# Altium footprint library Relays.PcbLib: 115 footprints (part 7 of 8) (continued)
## REL_TYCO_SCHRACK_SR6C [mm] "14 Leads, Row Spacing 10mm; Body 55mm x 16.5mm, TYCO SR6 Series"
height 16.5
pads (14):
  round 2 hole 1.3: 13(3.45,5) 14(-1.55,5) 21(-2.55,-5) 22(2.45,-5) 33(14.45,5) 34(9.45,5) 43(13.95,-5) 44(8.95,-5) 53(25.45,5) 54(20.45,5) 63(25.45,-5) 64(20.45,-5) A1(-25.05,6.25) A2(-25.05,-6.25)
Top Overlay:
  lines w0.2: -22.86,-6.25 -21,-6.25 -21,-0.5 ; -22.86,6.25 -21,6.25 -21,0.5 ; -21.25,-0.5 -20.75,0.5 ; -2.55,-3.25 -2.55,-2.25 -1.3,-2.25 -1.3,-1.25 ; -2.55,3.25 -2.55,2.25 -1.3,2.25 1.2,1.25 ; -1.55,-1.5 1.2,-2.25 2.45,-2.25 2.45,-3.25 ; 1.2,2.25 2.45,2.25 2.45,3.25 ; 8.95,-3.25 8.95,-2.25 10.2,-2.25 12.7,-1.25 ; 8.95,3.25 8.95,2.25 10.2,2.25 12.7,1.25 ; 12.7,-2.25 13.95,-2.25 13.95,-3.25 ; 12.7,2.25 13.95,2.25 13.95,3.25 ; 20.45,-3.25 20.45,-2.25 21.7,-2.25 24.2,-1.25 ; 20.45,3.25 20.45,2.25 21.7,2.25 24.2,1.25 ; 24.2,-2.25 25.45,-2.25 25.45,-3.25 ; 24.2,2.25 25.45,2.25 25.45,3.25 ; -27.5,-7.75 ccw(c-27,-7.75) -27,-8.25 27,-8.25 ccw(c27,-7.75) 27.5,-7.75 27.5,7.75 ccw(c27,7.75) 27,8.25 -27,8.25 ccw(c-27,7.75) -27.5,7.75 -27.5,-7.75 ; -22,-0.5 -20,-0.5 -20,0.5 -22,0.5 -22,-0.5
Mechanical 8:
  lines w0.1: -25.55,-6.25 -25.05,-6.25 ; -25.55,6.25 -25.05,6.25 ; -25.05,-6.75 -25.05,-6.25 ; -25.05,-5.75 -25.05,-6.25 ; -25.05,5.75 -25.05,6.25 ; -25.05,6.75 -25.05,6.25 ; -24.55,-6.25 -25.05,-6.25 ; -24.55,6.25 -25.05,6.25 ; -3.05,-5 -2.55,-5 ; -2.55,-5.5 -2.55,-5 ; -2.55,-4.5 -2.55,-5 ; -2.05,-5 -2.55,-5 ; -2.05,5 -1.55,5 ; -1.55,4.5 -1.55,5 ; -1.55,5.5 -1.55,5 ; -1.05,5 -1.55,5 ; -0.5,0 0,0 ; 0,-0.5 0,0 ; 0,0.5 0,0 ; 0.5,0 0,0 ; 1.95,-5 2.45,-5 ; 2.45,-5.5 2.45,-5 ; 2.45,-4.5 2.45,-5 ; 2.95,-5 2.45,-5 ; 2.95,5 3.45,5 ; 3.45,4.5 3.45,5 ; 3.45,5.5 3.45,5 ; 3.95,5 3.45,5 ; 8.45,-5 8.95,-5 ; 8.95,-5.5 8.95,-5 ; 8.95,-4.5 8.95,-5 ; 8.95,5 9.45,5 ; 9.45,-5 8.95,-5 ; 9.45,4.5 9.45,5 ; 9.45,5.5 9.45,5 ; 9.95,5 9.45,5 ; 13.45,-5 13.95,-5 ; 13.95,-5.5 13.95,-5 ; 13.95,-4.5 13.95,-5 ; 13.95,5 14.45,5 ; 14.45,-5 13.95,-5 ; 14.45,4.5 14.45,5 ; 14.45,5.5 14.45,5 ; 14.95,5 14.45,5 ; 19.95,-5 20.45,-5 ; 19.95,5 20.45,5 ; 20.45,-5.5 20.45,-5 ; 20.45,-4.5 20.45,-5 ; 20.45,4.5 20.45,5 ; 20.45,5.5 20.45,5 ; 20.95,-5 20.45,-5 ; 20.95,5 20.45,5 ; 24.95,-5 25.45,-5 ; 24.95,5 25.45,5 ; 25.45,-5.5 25.45,-5 ; 25.45,-4.5 25.45,-5 ; 25.45,4.5 25.45,5 ; 25.45,5.5 25.45,5 ; 25.95,-5 25.45,-5 ; 25.95,5 25.45,5
Mechanical 14:
  lines w0.1: -22.86,-6.25 -21,-6.25 -21,-0.5 ; -22.86,6.25 -21,6.25 -21,0.5 ; -21.25,-0.5 -20.75,0.5 ; -2.55,-3.25 -2.55,-2.25 -1.3,-2.25 -1.3,-1.25 ; -2.55,3.25 -2.55,2.25 -1.3,2.25 1.2,1.25 ; -1.55,-1.5 1.2,-2.25 2.45,-2.25 2.45,-3.25 ; 1.2,2.25 2.45,2.25 2.45,3.25 ; 8.95,-3.25 8.95,-2.25 10.2,-2.25 12.7,-1.25 ; 8.95,3.25 8.95,2.25 10.2,2.25 12.7,1.25 ; 12.7,-2.25 13.95,-2.25 13.95,-3.25 ; 12.7,2.25 13.95,2.25 13.95,3.25 ; 20.45,-3.25 20.45,-2.25 21.7,-2.25 24.2,-1.25 ; 20.45,3.25 20.45,2.25 21.7,2.25 24.2,1.25 ; 24.2,-2.25 25.45,-2.25 25.45,-3.25 ; 24.2,2.25 25.45,2.25 25.45,3.25 ; -27.5,-7.75 ccw(c-27,-7.75) -27,-8.25 27,-8.25 ccw(c27,-7.75) 27.5,-7.75 27.5,7.75 ccw(c27,7.75) 27,8.25 -27,8.25 ccw(c-27,7.75) -27.5,7.75 -27.5,-7.75 ; -22,-0.5 -22,0.5 -20,0.5 -20,-0.5 -22,-0.5
3D body "REL_TYCO_SCHRACK_SR6C.stp": height 16.5, standoff -3.3, extent -27.5,-8.25 27.5,8.25

## RELS_ENERDIS_65F-P01400153A [mm] "16 Leads, Row Spacing 10mm; Body 40mm x 45mm, Socket Relay, ENERDIS 65F Series"
height 21.5
Top Overlay:
  lines w0.2: -20,-22.5 -20,22.5 20,22.5 20,-22.5 -20,-22.5
Mechanical 8:
  circle w0.1: c0,0 r1.6
  circle w0.1: c17.5,0 r1.6
  lines w0.1: -15.5,-15.8 -15,-15.8 ; -15.5,-5.8 -15,-5.8 ; -15.5,5.8 -15,5.8 ; -15.5,15.8 -15,15.8 ; -15,-16.3 -15,-15.8 ; -15,-15.3 -15,-15.8 ; -15,-6.3 -15,-5.8 ; -15,-5.3 -15,-5.8 ; -15,5.3 -15,5.8 ; -15,6.3 -15,5.8 ; -15,15.3 -15,15.8 ; -15,16.3 -15,15.8 ; -14.5,-15.8 -15,-15.8 ; -14.5,-5.8 -15,-5.8 ; -14.5,5.8 -15,5.8 ; -14.5,15.8 -15,15.8 ; -5.5,-15.8 -5,-15.8 ; -5.5,-5.8 -5,-5.8 ; -5.5,5.8 -5,5.8 ; -5.5,15.8 -5,15.8 ; -5,-16.3 -5,-15.8 ; -5,-15.3 -5,-15.8 ; -5,-6.3 -5,-5.8 ; -5,-5.3 -5,-5.8 ; -5,5.3 -5,5.8 ; -5,6.3 -5,5.8 ; -5,15.3 -5,15.8 ; -5,16.3 -5,15.8 ; -4.5,-15.8 -5,-15.8 ; -4.5,-5.8 -5,-5.8 ; -4.5,5.8 -5,5.8 ; -4.5,15.8 -5,15.8 ; -0.5,0 0,0 ; 0,-0.5 0,0 ; 0,0.5 0,0 ; 0.5,0 0,0 ; 4.5,-15.8 5,-15.8 ; 4.5,-5.8 5,-5.8 ; 4.5,5.8 5,5.8 ; 4.5,15.8 5,15.8 ; 5,-16.3 5,-15.8 ; 5,-15.3 5,-15.8 ; 5,-6.3 5,-5.8 ; 5,-5.3 5,-5.8 ; 5,5.3 5,5.8 ; 5,6.3 5,5.8 ; 5,15.3 5,15.8 ; 5,16.3 5,15.8 ; 5.5,-15.8 5,-15.8 ; 5.5,-5.8 5,-5.8 ; 5.5,5.8 5,5.8 ; 5.5,15.8 5,15.8 ; 14.5,-15.8 15,-15.8 ; 14.5,-5.8 15,-5.8 ; 14.5,5.8 15,5.8 ; 14.5,15.8 15,15.8 ; 15,-16.3 15,-15.8 ; 15,-15.3 15,-15.8 ; 15,-6.3 15,-5.8 ; 15,-5.3 15,-5.8 ; 15,5.3 15,5.8 ; 15,6.3 15,5.8 ; 15,15.3 15,15.8 ; 15,16.3 15,15.8 ; 15.5,-15.8 15,-15.8 ; 15.5,-5.8 15,-5.8 ; 15.5,5.8 15,5.8 ; 15.5,15.8 15,15.8 ; 17,0 17.5,0 ; 17.5,-0.5 17.5,0 ; 17.5,0.5 17.5,0 ; 18,0 17.5,0
Mechanical 14:
  lines w0.1: -20,-22.5 -20,22.5 20,22.5 20,-22.5 -20,-22.5
3D body "RELS_ENERDIS_65F-P01400153A.stp": height 21.5, standoff -3.5, extent -20,-22.5 20,22.5

## RELS_ENERDIS_65F-P01400153A_A [mm] "16 Leads, Row Spacing 10mm; Body 40mm x 45mm, Socket Relay, ENERDIS 65F Series"
height 21.5
pads (18):
  round 3.9 hole 3.2: 1(0,0) 1(17.5,0)
  round 2.3 hole 1.6: a1(15,15.8) a2(5,15.8) a3(-5,15.8) a4(-15,15.8) b1(15,5.8) b2(5,5.8) b3(-5,5.8) b4(-15,5.8) c1(15,-5.8) c2(5,-5.8) c3(-5,-5.8) c4(-15,-5.8) d1(15,-15.8) d2(5,-15.8) d3(-5,-15.8) d4(-15,-15.8)
Top Overlay:
  lines w0.2: -20,-22.5 -20,22.5 20,22.5 20,-22.5 -20,-22.5
Mechanical 8:
  circle w0.1: c0,0 r1.6
  circle w0.1: c17.5,0 r1.6
  lines w0.1: -15.5,-15.8 -15,-15.8 ; -15.5,-5.8 -15,-5.8 ; -15.5,5.8 -15,5.8 ; -15.5,15.8 -15,15.8 ; -15,-16.3 -15,-15.8 ; -15,-15.3 -15,-15.8 ; -15,-6.3 -15,-5.8 ; -15,-5.3 -15,-5.8 ; -15,5.3 -15,5.8 ; -15,6.3 -15,5.8 ; -15,15.3 -15,15.8 ; -15,16.3 -15,15.8 ; -14.5,-15.8 -15,-15.8 ; -14.5,-5.8 -15,-5.8 ; -14.5,5.8 -15,5.8 ; -14.5,15.8 -15,15.8 ; -5.5,-15.8 -5,-15.8 ; -5.5,-5.8 -5,-5.8 ; -5.5,5.8 -5,5.8 ; -5.5,15.8 -5,15.8 ; -5,-16.3 -5,-15.8 ; -5,-15.3 -5,-15.8 ; -5,-6.3 -5,-5.8 ; -5,-5.3 -5,-5.8 ; -5,5.3 -5,5.8 ; -5,6.3 -5,5.8 ; -5,15.3 -5,15.8 ; -5,16.3 -5,15.8 ; -4.5,-15.8 -5,-15.8 ; -4.5,-5.8 -5,-5.8 ; -4.5,5.8 -5,5.8 ; -4.5,15.8 -5,15.8 ; -0.5,0 0,0 ; 0,-0.5 0,0 ; 0,0.5 0,0 ; 0.5,0 0,0 ; 4.5,-15.8 5,-15.8 ; 4.5,-5.8 5,-5.8 ; 4.5,5.8 5,5.8 ; 4.5,15.8 5,15.8 ; 5,-16.3 5,-15.8 ; 5,-15.3 5,-15.8 ; 5,-6.3 5,-5.8 ; 5,-5.3 5,-5.8 ; 5,5.3 5,5.8 ; 5,6.3 5,5.8 ; 5,15.3 5,15.8 ; 5,16.3 5,15.8 ; 5.5,-15.8 5,-15.8 ; 5.5,-5.8 5,-5.8 ; 5.5,5.8 5,5.8 ; 5.5,15.8 5,15.8 ; 14.5,-15.8 15,-15.8 ; 14.5,-5.8 15,-5.8 ; 14.5,5.8 15,5.8 ; 14.5,15.8 15,15.8 ; 15,-16.3 15,-15.8 ; 15,-15.3 15,-15.8 ; 15,-6.3 15,-5.8 ; 15,-5.3 15,-5.8 ; 15,5.3 15,5.8 ; 15,6.3 15,5.8 ; 15,15.3 15,15.8 ; 15,16.3 15,15.8 ; 15.5,-15.8 15,-15.8 ; 15.5,-5.8 15,-5.8 ; 15.5,5.8 15,5.8 ; 15.5,15.8 15,15.8 ; 17,0 17.5,0 ; 17.5,-0.5 17.5,0 ; 17.5,0.5 17.5,0 ; 18,0 17.5,0
Mechanical 14:
  lines w0.1: -20,-22.5 -20,22.5 20,22.5 20,-22.5 -20,-22.5

## RELS_FINDER_94.12 [mm] "Graphical Model for Relay Socket, FINDER_94.12 Series (Do Not Use Alone, Use Only With Relay)"
height 11.5
pads (2):
  round 1.5 smd paste-0.76 mask-0.76: 13(6.6,-7.25) 14(-6.6,-7.25)
Top Overlay:
  lines w0.2: -2,-14.75 -2,-14.25 2,-14.25 2,-14.75 ; -2,14.75 -2,14.25 2,14.25 2,14.75 ; -1,-14.25 -1,-14.75 -9.75,-14.75 cw(c-9.75,-13.75) -10.75,-13.75 -10.75,13.75 cw(c-9.75,13.75) -9.75,14.75 -1,14.75 -1,14.25 ; 1,-14.25 1,-14.75 9.75,-14.75 ccw(c9.75,-13.75) 10.75,-13.75 10.75,13.75 ccw(c9.75,13.75) 9.75,14.75 1,14.75 1,14.25
Mechanical 8:
  lines w0.1: -7.6,-7.25 -6.6,-7.25 -6.6,-8.25 ; -7.6,-0.95 -6.6,-0.95 -6.6,-1.95 ; -7.6,5.35 -6.6,5.35 -6.6,4.35 ; -7.6,9.45 -6.6,9.45 -6.6,8.45 ; 5.6,-7.25 6.6,-7.25 6.6,-8.25 ; 5.6,-0.95 6.6,-0.95 6.6,-1.95 ; 5.6,5.35 6.6,5.35 6.6,4.35 ; 5.6,9.45 6.6,9.45 6.6,8.45
  text "A1" at 9.35,-8.25 h1.5
  text "11" at 9.35,-1.7 h1.5
  text "12" at 9.35,8.45 h1.5
  text "14" at 9.35,4.35 h1.5
  text "13" at 5.35,-8.25 h1.5
  text "9" at 5.35,-1.45 h1.5
  text "1" at 5.35,9.2 h1.5
  text "5" at 5.35,4.85 h1.5
  text "14" at -3.85,-8.25 h1.5
  text "12" at -3.85,-1.95 h1.5
  text "4" at -3.85,8.95 h1.5
  text "8" at -3.85,4.85 h1.5
  text "A2" at -7.85,-8.5 h1.5
  text "41" at -7.85,-1.95 h1.5
  text "42" at -7.85,8.2 h1.5
  text "44" at -7.85,4.1 h1.5
  text "Must be Used with FINDER 55.32 Relay" at 2.54,-12.7 h0.95
Mechanical 14:
  lines w0.1: -2,-14.75 -2,-14.25 2,-14.25 2,-14.75 ; -2,14.75 -2,14.25 2,14.25 2,14.75 ; -1,-14.25 -1,-14.75 -9.75,-14.75 cw(c-9.75,-13.75) -10.75,-13.75 -10.75,13.75 cw(c-9.75,13.75) -9.75,14.75 -1,14.75 -1,14.25 ; 1,-14.25 1,-14.75 9.75,-14.75 ccw(c9.75,-13.75) 10.75,-13.75 10.75,13.75 ccw(c9.75,13.75) 9.75,14.75 1,14.75 1,14.25 ; -8.101,-8.45 -5.101,-8.45 -5.101,-6.05 -8.101,-6.05 -8.101,-8.45 ; -8.101,-2.15 -5.101,-2.15 -5.101,0.25 -8.101,0.25 -8.101,-2.15 ; -8.101,4.15 -5.101,4.15 -5.101,6.55 -8.101,6.55 -8.101,4.15 ; -8.101,8.25 -5.101,8.25 -5.101,10.65 -8.101,10.65 -8.101,8.25 ; 5.1,-8.45 8.1,-8.45 8.1,-6.05 5.1,-6.05 5.1,-8.45 ; 5.1,-2.15 8.1,-2.15 8.1,0.25 5.1,0.25 5.1,-2.15 ; 5.1,4.15 8.1,4.15 8.1,6.55 5.1,6.55 5.1,4.15 ; 5.1,8.25 8.1,8.25 8.1,10.65 5.1,10.65 5.1,8.25
3D body "RELS_FINDER_94.12.stp": height 11.5, standoff -3.7, extent -10.749,-14.75 10.751,14.75

## RELS_FINDER_94.12_a [mm] "8 Leads Relay Socket, Row Spacing 13.2mm; Body 21.5mm x 29.5mm, FINDER_94.12 Series (Use Only Without Relay)"
height 11.5
pads (8):
  round 2.2 hole 1.5: 1(6.6,9.45) 4(-6.6,9.45) 5(6.6,5.35) 8(-6.6,5.35) 9(6.6,-0.95) 12(-6.6,-0.95) 13(6.6,-7.25) 14(-6.6,-7.25)
Top Overlay:
  lines w0.2: -2,-14.75 -2,-14.25 2,-14.25 2,-14.75 ; -2,14.75 -2,14.25 2,14.25 2,14.75 ; -1,-14.25 -1,-14.75 -9.75,-14.75 cw(c-9.75,-13.75) -10.75,-13.75 -10.75,13.75 cw(c-9.75,13.75) -9.75,14.75 -1,14.75 -1,14.25 ; 1,-14.25 1,-14.75 9.75,-14.75 ccw(c9.75,-13.75) 10.75,-13.75 10.75,13.75 ccw(c9.75,13.75) 9.75,14.75 1,14.75 1,14.25
Mechanical 8:
  lines w0.1: -7.6,-7.25 -6.6,-7.25 -6.6,-8.25 ; -7.6,-0.95 -6.6,-0.95 -6.6,-1.95 ; -7.6,5.35 -6.6,5.35 -6.6,4.35 ; -7.6,9.45 -6.6,9.45 -6.6,8.45 ; -1,0 0,0 0,-1 ; 5.6,-7.25 6.6,-7.25 6.6,-8.25 ; 5.6,-0.95 6.6,-0.95 6.6,-1.95 ; 5.6,5.35 6.6,5.35 6.6,4.35 ; 5.6,9.45 6.6,9.45 6.6,8.45
  text "A1" at 9.35,-8.25 h1.5
  text "11" at 9.35,-1.7 h1.5
  text "12" at 9.35,8.45 h1.5
  text "14" at 9.35,4.35 h1.5
  text "13" at 5.35,-8.25 h1.5
  text "9" at 5.35,-1.45 h1.5
  text "1" at 5.35,9.2 h1.5
  text "5" at 5.35,4.85 h1.5
  text "14" at -3.85,-8.25 h1.5
  text "12" at -3.85,-1.95 h1.5
  text "4" at -3.85,8.95 h1.5
  text "8" at -3.85,4.85 h1.5
  text "A2" at -7.85,-8.5 h1.5
  text "41" at -7.85,-1.95 h1.5
  text "42" at -7.85,8.2 h1.5
  text "44" at -7.85,4.1 h1.5
Mechanical 14:
  lines w0.1: -2,-14.75 -2,-14.25 2,-14.25 2,-14.75 ; -2,14.75 -2,14.25 2,14.25 2,14.75 ; -1,-14.25 -1,-14.75 -9.75,-14.75 cw(c-9.75,-13.75) -10.75,-13.75 -10.75,13.75 cw(c-9.75,13.75) -9.75,14.75 -1,14.75 -1,14.25 ; 1,-14.25 1,-14.75 9.75,-14.75 ccw(c9.75,-13.75) 10.75,-13.75 10.75,13.75 ccw(c9.75,13.75) 9.75,14.75 1,14.75 1,14.25 ; -8.101,-8.45 -5.101,-8.45 -5.101,-6.05 -8.101,-6.05 -8.101,-8.45 ; -8.101,-2.15 -5.101,-2.15 -5.101,0.25 -8.101,0.25 -8.101,-2.15 ; -8.101,4.15 -5.101,4.15 -5.101,6.55 -8.101,6.55 -8.101,4.15 ; -8.101,8.25 -5.101,8.25 -5.101,10.65 -8.101,10.65 -8.101,8.25 ; 5.1,-8.45 8.1,-8.45 8.1,-6.05 5.1,-6.05 5.1,-8.45 ; 5.1,-2.15 8.1,-2.15 8.1,0.25 5.1,0.25 5.1,-2.15 ; 5.1,4.15 8.1,4.15 8.1,6.55 5.1,6.55 5.1,4.15 ; 5.1,8.25 8.1,8.25 8.1,10.65 5.1,10.65 5.1,8.25
3D body "RELS_FINDER_94.12.stp": height 11.5, standoff -3.7, extent -10.749,-14.75 10.751,14.75

## RELS_FINDER_94.14SMA [mm] "Graphical Model for Relay Socket, FINDER_94.14 Series (Do Not Use Alone, Use Only With Relay)"
height 11.5
pads (2):
  round 1.5 smd paste-0.76 mask-0.76: 13(6.6,-7.25) 14(-6.6,-7.25)
Top Overlay:
  lines w0.2: -2,-14.75 -2,-14.25 2,-14.25 2,-14.75 ; -2,14.75 -2,14.25 2,14.25 2,14.75 ; -1,-14.75 -1,-14.25 ; -1,14.25 -1,14.75 ; 1,-14.75 1,-14.25 ; 1,14.25 1,14.75 ; -10.75,-13.75 ccw(c-9.75,-13.75) -9.75,-14.75 9.75,-14.75 ccw(c9.75,-13.75) 10.75,-13.75 10.75,13.75 ccw(c9.75,13.75) 9.75,14.75 -9.75,14.75 ccw(c-9.75,13.75) -10.75,13.75 -10.75,-13.75
Mechanical 8:
  lines w0.1: -7.6,9.45 -6.6,9.45 ; -7.1,-7.25 -6.6,-7.25 ; -7.1,-0.95 -6.6,-0.95 ; -7.1,5.35 -6.6,5.35 ; -7.1,9.45 -6.6,9.45 ; -6.6,-7.75 -6.6,-7.25 ; -6.6,-6.75 -6.6,-7.25 ; -6.6,-1.45 -6.6,-0.95 ; -6.6,-0.45 -6.6,-0.95 ; -6.6,4.85 -6.6,5.35 ; -6.6,5.85 -6.6,5.35 ; -6.6,8.45 -6.6,9.45 ; -6.6,8.95 -6.6,9.45 ; -6.6,9.95 -6.6,9.45 ; -6.1,-7.25 -6.6,-7.25 ; -6.1,-0.95 -6.6,-0.95 ; -6.1,5.35 -6.6,5.35 ; -6.1,9.45 -6.6,9.45 ; -2.7,-0.95 -2.2,-0.95 ; -2.7,5.35 -2.2,5.35 ; -2.7,9.45 -2.2,9.45 ; -2.2,-1.45 -2.2,-0.95 ; -2.2,-0.45 -2.2,-0.95 ; -2.2,4.85 -2.2,5.35 ; -2.2,5.85 -2.2,5.35 ; -2.2,8.95 -2.2,9.45 ; -2.2,9.95 -2.2,9.45 ; -1.7,-0.95 -2.2,-0.95 ; -1.7,5.35 -2.2,5.35 ; -1.7,9.45 -2.2,9.45 ; -0.5,0 0,0 ; 0,-0.5 0,0 ; 0,0.5 0,0 ; 0.5,0 0,0 ; 1.7,-0.95 2.2,-0.95 ; 1.7,5.35 2.2,5.35 ; 1.7,9.45 2.2,9.45 ; 2.2,-1.45 2.2,-0.95 ; 2.2,-0.45 2.2,-0.95 ; 2.2,4.85 2.2,5.35 ; 2.2,5.85 2.2,5.35 ; 2.2,8.95 2.2,9.45 ; 2.2,9.95 2.2,9.45 ; 2.7,-0.95 2.2,-0.95 ; 2.7,5.35 2.2,5.35 ; 2.7,9.45 2.2,9.45 ; 6.1,-7.25 6.6,-7.25 ; 6.1,-0.95 6.6,-0.95 ; 6.1,5.35 6.6,5.35 ; 6.1,9.45 6.6,9.45 ; 6.6,-7.75 6.6,-7.25 ; 6.6,-6.75 6.6,-7.25 ; 6.6,-1.45 6.6,-0.95 ; 6.6,-0.45 6.6,-0.95 ; 6.6,4.85 6.6,5.35 ; 6.6,5.85 6.6,5.35 ; 6.6,8.95 6.6,9.45 ; 6.6,9.95 6.6,9.45 ; 7.1,-7.25 6.6,-7.25 ; 7.1,-0.95 6.6,-0.95 ; 7.1,5.35 6.6,5.35 ; 7.1,9.45 6.6,9.45
  text "14" at -7.9,-8.55 h1.5
  text "13" at 5.3,-8.55 h1.5
  text "12" at -7.85,-1.95 h1.5
  text "4" at -7.9,8.8 h1.5
  text "8" at -7.9,4.8 h1.5
  text "Must be Used with" at -6.5,-3.8 h0.95
  text "7" at -3.5,4.8 h1.5
  text "3" at -3.5,8.9 h1.5
  text "2" at 0.9,8.9 h1.5
  text "6" at 0.9,4.8 h1.5
  text "11" at -3.5,-1.5 h1.5
  text "10" at 0.9,-2 h1.5
  text "9" at 5.3,-1.5 h1.5
  text "5" at 5.3,4.8 h1.5
  text "1" at 5.3,8.9 h1.5
  text "FINDER 55.32 Relay" at -6.55,-5.533 h0.95
Mechanical 14:
  lines w0.1: -2,-14.75 -2,-14.25 2,-14.25 2,-14.75 ; -2,14.75 -2,14.25 2,14.25 2,14.75 ; -1,-14.75 -1,-14.25 ; -1,14.25 -1,14.75 ; 1,-14.75 1,-14.25 ; 1,14.25 1,14.75 ; -10.75,-13.75 ccw(c-9.75,-13.75) -9.75,-14.75 9.75,-14.75 ccw(c9.75,-13.75) 10.75,-13.75 10.75,13.75 ccw(c9.75,13.75) 9.75,14.75 -9.75,14.75 ccw(c-9.75,13.75) -10.75,13.75 -10.75,-13.75 ; -8.142,-8.719 -8.142,-6.319 -5.142,-6.319 -5.142,-8.719 -8.142,-8.719 ; -8.142,-2.369 -5.142,-2.369 -5.142,0.031 -8.142,0.031 -8.142,-2.369 ; -8.142,3.931 -8.142,6.331 -5.142,6.331 -5.142,3.931 -8.142,3.931 ; -8.142,8.031 -8.142,10.431 -5.142,10.431 -5.142,8.031 -8.142,8.031 ; -3.701,-2.369 -3.701,0.031 -0.701,0.031 -0.701,-2.369 -3.701,-2.369 ; -3.701,3.931 -0.701,3.931 -0.701,6.331 -3.701,6.331 -3.701,3.931 ; -3.701,8.031 -0.701,8.031 -0.701,10.431 -3.701,10.431 -3.701,8.031 ; -2,-8.65 -2,-5.25 2,-5.25 2,-8.65 -2,-8.65 ; 0.748,-2.369 0.748,0.031 3.748,0.031 3.748,-2.369 0.748,-2.369 ; 0.748,3.931 0.748,6.331 3.748,6.331 3.748,3.931 0.748,3.931 ; 0.748,8.031 0.748,10.431 3.748,10.431 3.748,8.031 0.748,8.031 ; 5.188,-8.719 8.188,-8.719 8.188,-6.319 5.188,-6.319 5.188,-8.719 ; 5.188,-2.369 5.188,0.031 8.188,0.031 8.188,-2.369 5.188,-2.369 ; 5.188,3.931 8.188,3.931 8.188,6.331 5.188,6.331 5.188,3.931 ; 5.188,8.031 8.188,8.031 8.188,10.431 5.188,10.431 5.188,8.031
3D body "RELS_FINDER_94.14SMA.stp": height 11.5, standoff -3.7, extent -10.75,-14.75 10.75,14.75

## RELS_FINDER_94.14SMA_a [mm] "14 Leads Relay Socket, Row Spacing 4.4mm; Body 21.5mm x 29.5mm, FINDER_94.14 Series (Use Only Without Relay)"
height 11.5
pads (14):
  round 2.2 hole 1.5: 1(6.6,9.35) 2(2.2,9.35) 3(-2.2,9.35) 4(-6.6,9.35) 5(6.6,5.25) 6(2.2,5.25) 7(-2.2,5.25) 8(-6.6,5.25) 9(6.6,-1.1) 10(2.2,-1.1) 11(-2.2,-1.1) 12(-6.6,-1.1) 13(6.6,-7.45) 14(-6.6,-7.45)
Top Overlay:
  lines w0.2: -2,-14.75 -2,-14.25 2,-14.25 2,-14.75 ; -2,14.75 -2,14.25 2,14.25 2,14.75 ; -1,-14.75 -1,-14.25 ; -1,14.25 -1,14.75 ; 1,-14.75 1,-14.25 ; 1,14.25 1,14.75 ; -10.75,-13.75 ccw(c-9.75,-13.75) -9.75,-14.75 9.75,-14.75 ccw(c9.75,-13.75) 10.75,-13.75 10.75,13.75 ccw(c9.75,13.75) 9.75,14.75 -9.75,14.75 ccw(c-9.75,13.75) -10.75,13.75 -10.75,-13.75
Mechanical 8:
  lines w0.1: -7.6,9.45 -6.6,9.45 ; -7.1,-7.25 -6.6,-7.25 ; -7.1,-0.95 -6.6,-0.95 ; -7.1,5.35 -6.6,5.35 ; -7.1,9.45 -6.6,9.45 ; -6.6,-7.75 -6.6,-7.25 ; -6.6,-6.75 -6.6,-7.25 ; -6.6,-1.45 -6.6,-0.95 ; -6.6,-0.45 -6.6,-0.95 ; -6.6,4.85 -6.6,5.35 ; -6.6,5.85 -6.6,5.35 ; -6.6,8.45 -6.6,9.45 ; -6.6,8.95 -6.6,9.45 ; -6.6,9.95 -6.6,9.45 ; -6.1,-7.25 -6.6,-7.25 ; -6.1,-0.95 -6.6,-0.95 ; -6.1,5.35 -6.6,5.35 ; -6.1,9.45 -6.6,9.45 ; -2.7,-0.95 -2.2,-0.95 ; -2.7,5.35 -2.2,5.35 ; -2.7,9.45 -2.2,9.45 ; -2.2,-1.45 -2.2,-0.95 ; -2.2,-0.45 -2.2,-0.95 ; -2.2,4.85 -2.2,5.35 ; -2.2,5.85 -2.2,5.35 ; -2.2,8.95 -2.2,9.45 ; -2.2,9.95 -2.2,9.45 ; -1.7,-0.95 -2.2,-0.95 ; -1.7,5.35 -2.2,5.35 ; -1.7,9.45 -2.2,9.45 ; -0.5,0 0,0 ; 0,-0.5 0,0 ; 0,0.5 0,0 ; 0.5,0 0,0 ; 1.7,-0.95 2.2,-0.95 ; 1.7,5.35 2.2,5.35 ; 1.7,9.45 2.2,9.45 ; 2.2,-1.45 2.2,-0.95 ; 2.2,-0.45 2.2,-0.95 ; 2.2,4.85 2.2,5.35 ; 2.2,5.85 2.2,5.35 ; 2.2,8.95 2.2,9.45 ; 2.2,9.95 2.2,9.45 ; 2.7,-0.95 2.2,-0.95 ; 2.7,5.35 2.2,5.35 ; 2.7,9.45 2.2,9.45 ; 6.1,-7.25 6.6,-7.25 ; 6.1,-0.95 6.6,-0.95 ; 6.1,5.35 6.6,5.35 ; 6.1,9.45 6.6,9.45 ; 6.6,-7.75 6.6,-7.25 ; 6.6,-6.75 6.6,-7.25 ; 6.6,-1.45 6.6,-0.95 ; 6.6,-0.45 6.6,-0.95 ; 6.6,4.85 6.6,5.35 ; 6.6,5.85 6.6,5.35 ; 6.6,8.95 6.6,9.45 ; 6.6,9.95 6.6,9.45 ; 7.1,-7.25 6.6,-7.25 ; 7.1,-0.95 6.6,-0.95 ; 7.1,5.35 6.6,5.35 ; 7.1,9.45 6.6,9.45
  text "12" at -7.85,-1.95 h1.5
  text "4" at -7.9,8.8 h1.5
  text "8" at -7.9,4.8 h1.5
  text "7" at -3.5,4.8 h1.5
  text "3" at -3.5,8.9 h1.5
  text "2" at 0.9,8.9 h1.5
  text "6" at 0.9,4.8 h1.5
  text "11" at -3.5,-1.5 h1.5
  text "10" at 0.9,-2 h1.5
  text "9" at 5.3,-1.5 h1.5
  text "5" at 5.3,4.8 h1.5
  text "1" at 5.3,8.9 h1.5
  text "13" at 5.3,-8.55 h1.5
  text "14" at -7.9,-8.55 h1.5
Mechanical 14:
  lines w0.1: -2,-14.75 -2,-14.25 2,-14.25 2,-14.75 ; -2,14.75 -2,14.25 2,14.25 2,14.75 ; -1,-14.75 -1,-14.25 ; -1,14.25 -1,14.75 ; 1,-14.75 1,-14.25 ; 1,14.25 1,14.75 ; -10.75,-13.75 ccw(c-9.75,-13.75) -9.75,-14.75 9.75,-14.75 ccw(c9.75,-13.75) 10.75,-13.75 10.75,13.75 ccw(c9.75,13.75) 9.75,14.75 -9.75,14.75 ccw(c-9.75,13.75) -10.75,13.75 -10.75,-13.75 ; -8.142,-8.719 -8.142,-6.319 -5.142,-6.319 -5.142,-8.719 -8.142,-8.719 ; -8.142,-2.369 -5.142,-2.369 -5.142,0.031 -8.142,0.031 -8.142,-2.369 ; -8.142,3.931 -8.142,6.331 -5.142,6.331 -5.142,3.931 -8.142,3.931 ; -8.142,8.031 -8.142,10.431 -5.142,10.431 -5.142,8.031 -8.142,8.031 ; -3.701,-2.369 -3.701,0.031 -0.701,0.031 -0.701,-2.369 -3.701,-2.369 ; -3.701,3.931 -0.701,3.931 -0.701,6.331 -3.701,6.331 -3.701,3.931 ; -3.701,8.031 -0.701,8.031 -0.701,10.431 -3.701,10.431 -3.701,8.031 ; -2,-8.65 -2,-5.25 2,-5.25 2,-8.65 -2,-8.65 ; 0.748,-2.369 0.748,0.031 3.748,0.031 3.748,-2.369 0.748,-2.369 ; 0.748,3.931 0.748,6.331 3.748,6.331 3.748,3.931 0.748,3.931 ; 0.748,8.031 0.748,10.431 3.748,10.431 3.748,8.031 0.748,8.031 ; 5.188,-8.719 8.188,-8.719 8.188,-6.319 5.188,-6.319 5.188,-8.719 ; 5.188,-2.369 5.188,0.031 8.188,0.031 8.188,-2.369 5.188,-2.369 ; 5.188,3.931 8.188,3.931 8.188,6.331 5.188,6.331 5.188,3.931 ; 5.188,8.031 8.188,8.031 8.188,10.431 5.188,10.431 5.188,8.031
3D body "RELS_FINDER_94.14SMA.stp": height 11.5, standoff -3.7, extent -10.75,-14.75 10.75,14.75

## RELS_PANASONIC_SFS4-PS [mm] "10 Leads Relay Socket, Row Spacing 10.16mm; Body 50mm x 15mm, PANASONIC_SF Series"
height 40
pads (13):
  round 1.8 hole 1.1: 1(-18.17,-5.08) 2(-18.17,5.08) 3(-4.2,-5.08) 4(0.88,-5.08) 5(-4.2,5.08) 6(0.88,5.08) 7(12.31,-5.08) 8(17.39,-5.08) 9(12.31,5.08) 10(17.39,5.08)
  round 0.5 hole 3.2 unplated mask+1.35: 11(-22.27,0) 12(6.63,0) 13(21.73,0)
Top Overlay:
  lines w0.2: -25.1,-4.2 -20,-4.2 ; -25.1,4.2 -20,4.2 ; -23.1,-4.2 -23.1,-2.1 ; -23.1,2.1 -23.1,4.2 ; -20.3,-4.2 -20.3,-6.6 -13.1,-6.6 -13.1,-7.5 ; -20.3,4.2 -20.3,6.6 -13.1,6.6 -13.1,7.5 ; 12.9,-7.5 12.9,-6.6 20.1,-6.6 20.1,-4.2 ; 12.9,7.5 12.9,6.6 20.1,6.6 20.1,4.2 ; 20,-4.2 24.9,-4.2 ; 20,4.2 24.9,4.2 ; 22.9,-4.2 22.9,-2.1 ; 22.9,2.1 22.9,4.2 ; -25.1,-7.2 ccw(c-24.8,-7.2) -24.8,-7.5 24.6,-7.5 ccw(c24.6,-7.2) 24.9,-7.2 24.9,7.2 ccw(c24.6,7.2) 24.6,7.5 -24.8,7.5 ccw(c-24.8,7.2) -25.1,7.2 -25.1,-7.2
Mechanical 8:
  lines w0.05: -22.77,0 -22.27,0 ; -22.27,-0.5 -22.27,0 ; -22.27,0.5 -22.27,0 ; -21.77,0 -22.27,0 ; -18.67,-5.08 -18.17,-5.08 ; -18.67,5.08 -18.17,5.08 ; -18.17,-5.58 -18.17,-5.08 ; -18.17,-4.58 -18.17,-5.08 ; -18.17,4.58 -18.17,5.08 ; -18.17,5.58 -18.17,5.08 ; -17.67,-5.08 -18.17,-5.08 ; -17.67,5.08 -18.17,5.08 ; -4.7,-5.08 -4.2,-5.08 ; -4.7,5.08 -4.2,5.08 ; -4.2,-5.58 -4.2,-5.08 ; -4.2,-4.58 -4.2,-5.08 ; -4.2,4.58 -4.2,5.08 ; -4.2,5.58 -4.2,5.08 ; -3.7,-5.08 -4.2,-5.08 ; -3.7,5.08 -4.2,5.08 ; -0.5,0 0,0 ; 0,-0.5 0,0 ; 0,0.5 0,0 ; 0.38,-5.08 0.88,-5.08 ; 0.38,5.08 0.88,5.08 ; 0.5,0 0,0 ; 0.88,-5.58 0.88,-5.08 ; 0.88,-4.58 0.88,-5.08 ; 0.88,0.5 0.88,0 1.38,0 ; 0.88,4.58 0.88,5.08 ; 0.88,5.58 0.88,5.08 ; 1.38,-5.08 0.88,-5.08 ; 1.38,5.08 0.88,5.08 ; 6.13,0 6.63,0 ; 6.63,-0.5 6.63,0 ; 6.63,0.5 6.63,0 ; 7.13,0 6.63,0 ; 11.81,-5.08 12.31,-5.08 ; 11.81,5.08 12.31,5.08 ; 12.31,-5.58 12.31,-5.08 ; 12.31,-4.58 12.31,-5.08 ; 12.31,4.58 12.31,5.08 ; 12.31,5.58 12.31,5.08 ; 12.81,-5.08 12.31,-5.08 ; 12.81,5.08 12.31,5.08 ; 16.89,-5.08 17.39,-5.08 ; 16.89,5.08 17.39,5.08 ; 17.39,-5.58 17.39,-5.08 ; 17.39,-4.58 17.39,-5.08 ; 17.39,4.58 17.39,5.08 ; 17.39,5.58 17.39,5.08 ; 17.89,-5.08 17.39,-5.08 ; 17.89,5.08 17.39,5.08 ; 21.23,0 21.73,0 ; 21.73,-0.5 21.73,0 ; 21.73,0.5 21.73,0 ; 22.23,0 21.73,0 ; -20,-6.2 ccw(c-19.7,-6.2) -19.7,-6.5 19.7,-6.5 ccw(c19.7,-6.2) 20,-6.2 20,6.2 ccw(c19.7,6.2) 19.7,6.5 -19.7,6.5 ccw(c-19.7,6.2) -20,6.2 -20,-6.2
  text "8" at 17.1,-3.6 h1
  text "7" at 12,-3.6 h1
  text "4" at 0.5,-3.6 h1
  text "3" at -4.5,-3.6 h1
  text "10" at 16.7,2.6 h1
  text "9" at 11.98,2.6 h1
  text "6" at 0.55,2.6 h1
  text "5" at -4.53,2.6 h1
  text "2" at -18.5,2.6 h1
  text "1" at -18.3,-3.6 h1
Mechanical 14:
  lines w0.1: -25.1,-4.2 -17.6,-4.2 -17.6,4.2 -25.1,4.2 ; -23.1,-4.2 -23.1,4.2 ; -20.3,-4.2 -20.3,-6.6 -13.1,-6.6 -13.1,-7.5 ; -20.3,4.2 -20.3,6.6 -13.1,6.6 -13.1,7.5 ; -19.02,-4.2 -19.02,-6.03 -17.32,-6.03 -17.32,-4.13 -17.6,-4.13 ; -19.02,4.2 -19.02,6.03 -17.32,6.03 -17.32,4.13 -17.6,4.13 ; -17.6,-2.38 -8.7,-2.38 -8.7,2.38 -17.6,2.38 ; -17.6,-0.75 -10.4,-0.75 -10.4,-2.38 ; -17.6,0.75 -10.4,0.75 -10.4,2.38 ; 10.2,-2.38 10.2,-0.75 17.4,-0.75 ; 10.2,2.38 10.2,0.75 17.4,0.75 ; 12.9,-7.5 12.9,-6.6 20.1,-6.6 20.1,-4.2 ; 12.9,7.5 12.9,6.6 20.1,6.6 20.1,4.2 ; 17.4,-4.13 16.54,-4.13 16.54,-6.03 18.24,-6.03 18.24,-4.2 ; 17.4,-2.38 8.5,-2.38 8.5,2.38 17.4,2.38 ; 17.4,4.13 16.54,4.13 16.54,6.03 18.24,6.03 18.24,4.2 ; 22.9,-4.2 22.9,4.2 ; 24.9,-4.2 17.4,-4.2 17.4,4.2 24.9,4.2 ; -25.1,-7.2 ccw(c-24.8,-7.2) -24.8,-7.5 24.6,-7.5 ccw(c24.6,-7.2) 24.9,-7.2 24.9,7.2 ccw(c24.6,7.2) 24.6,7.5 -24.8,7.5 ccw(c-24.8,7.2) -25.1,7.2 -25.1,-7.2 ; -5.05,-6.03 -3.35,-6.03 -3.35,-4.13 -5.05,-4.13 -5.05,-6.03 ; -5.05,4.13 -3.35,4.13 -3.35,6.03 -5.05,6.03 -5.05,4.13 ; 0.03,-6.03 1.73,-6.03 1.73,-4.13 0.03,-4.13 0.03,-6.03 ; 0.03,4.13 1.73,4.13 1.73,6.03 0.03,6.03 0.03,4.13 ; 11.46,-6.03 13.16,-6.03 13.16,-4.13 11.46,-4.13 11.46,-6.03 ; 11.46,4.13 13.16,4.13 13.16,6.03 11.46,6.03 11.46,4.13
3D body "RELS_PANASONIC_SFS4-PS.stp": height 39.4, standoff -3.5, extent -25.1,-7.5 24.9,7.5